# Altium footprint library ICs And Semiconductors THD.PcbLib: 350 footprints (part 2 of 22)
Each footprint in its own frame and in the unit in brackets; x right, y up, seen from the top. Pads: shape width x height; smd on the part's side, far side on the other; paste and mask are expansions set on the pad; w line width, h text height; cw(c..) or ccw(c..) is an arc to the next point about the centre after c.
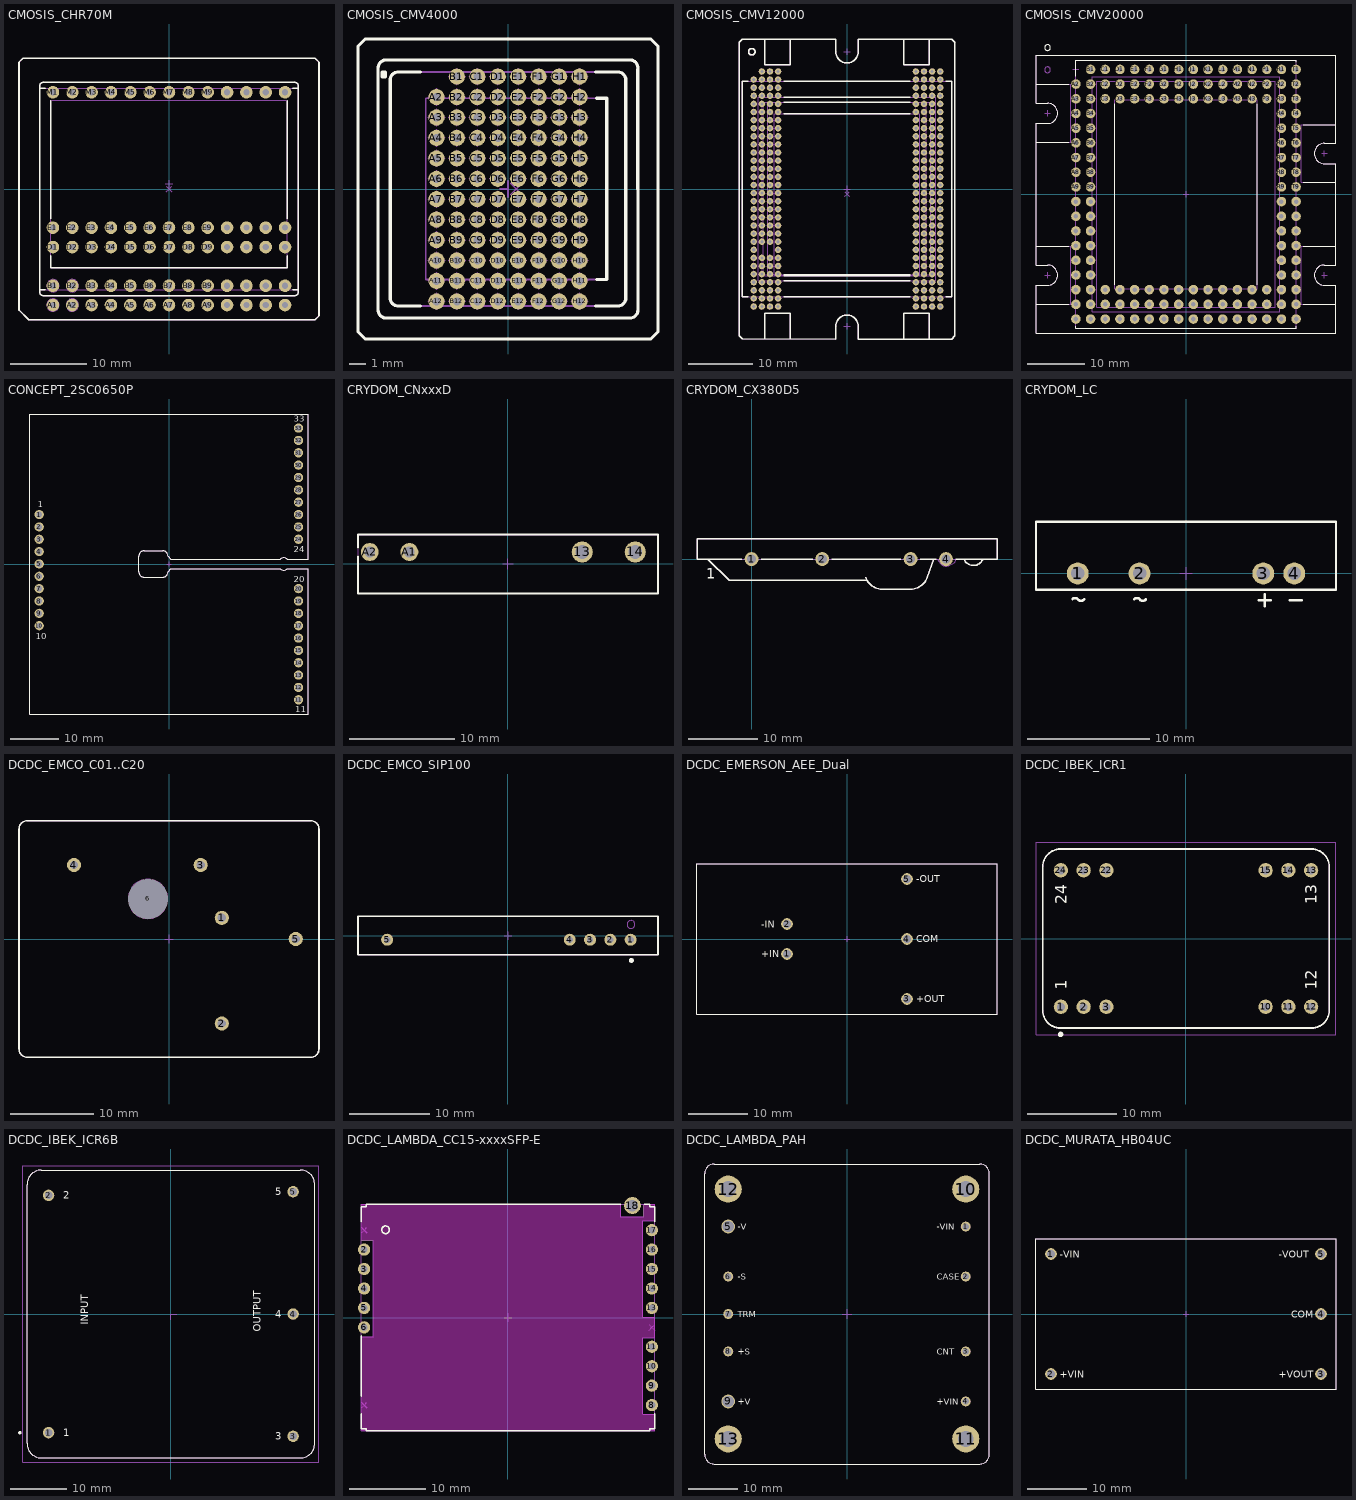
[diagram p1: the footprints below, top view; thin cyan lines are the x and y axes]

## CMOSIS_CHR70M [mm] "High Resolution 70 Megapixels CMOS Image Sensor"
height 6.24
pads (65):
  round 1.65 hole 0.8: A1(-15.24,-15.24) A2(-12.7,-15.24) A3(-10.16,-15.24) A4(-7.62,-15.24) A5(-5.08,-15.24) A6(-2.54,-15.24) A7(0,-15.24) A8(2.54,-15.24) A9(5.08,-15.24) A10(7.62,-15.24) A11(10.16,-15.24) A12(12.7,-15.24) A13(15.24,-15.24) B1(-15.24,-12.7) B2(-12.7,-12.7) B3(-10.16,-12.7) B4(-7.62,-12.7) B5(-5.08,-12.7) B6(-2.54,-12.7) B7(0,-12.7) B8(2.54,-12.7) B9(5.08,-12.7) B10(7.62,-12.7) B11(10.16,-12.7) B12(12.7,-12.7) B13(15.24,-12.7) D1(-15.24,-7.62) D2(-12.7,-7.62) D3(-10.16,-7.62) D4(-7.62,-7.62) D5(-5.08,-7.62) D6(-2.54,-7.62) D7(0,-7.62) D8(2.54,-7.62) D9(5.08,-7.62) D10(7.62,-7.62) D11(10.16,-7.62) D12(12.7,-7.62) D13(15.24,-7.62) E1(-15.24,-5.08) E2(-12.7,-5.08) E3(-10.16,-5.08) E4(-7.62,-5.08) E5(-5.08,-5.08) E6(-2.54,-5.08) E7(0,-5.08) E8(2.54,-5.08) E9(5.08,-5.08) E10(7.62,-5.08) E11(10.16,-5.08) E12(12.7,-5.08) E13(15.24,-5.08) M1(-15.24,12.7) M2(-12.7,12.7) M3(-10.16,12.7) M4(-7.62,12.7) M5(-5.08,12.7) M6(-2.54,12.7) M7(0,12.7) M8(2.54,12.7) M9(5.08,12.7) M10(7.62,12.7) M11(10.16,12.7) M12(12.7,12.7) M13(15.24,12.7)
Top Overlay:
  lines w0.2: -17,-13.25 -16.278,-13.25 ; -17,13.25 -16.278,13.25 ; -15.5,-8.766 -15.5,-10.33 15.5,-10.33 15.5,-8.766 ; -15.5,-3.934 -15.5,11.554 ; 15.5,-3.934 15.5,11.554 ; 16.278,-13.25 17,-13.25 ; 16.278,13.25 17,13.25 ; -19.695,-15.9 -18.425,-17.17 19.185,-17.17 19.695,-16.66 19.695,16.66 19.185,17.17 -19.185,17.17 -19.695,16.66 -19.695,-15.9 ; -17,-13.5 ccw(c-16.5,-13.5) -16.5,-14 16.5,-14 ccw(c16.5,-13.5) 17,-13.5 17,13.5 ccw(c16.5,13.5) 16.5,14 -16.5,14 ccw(c-16.5,13.5) -17,13.5 -17,-13.5
Notvisible:
  drawing of 269 lines, arcs and shapes, not listed
Mechanical 14:
  lines w0.1: -17,-13.25 17,-13.25 ; -17,13.25 17,13.25 ; -0.5,0.67 0,0.67 ; 0,0.17 0,0.67 ; 0,1.17 0,0.67 ; 0.5,0.67 0,0.67 ; -19.695,-15.9 -18.425,-17.17 19.185,-17.17 19.695,-16.66 19.695,16.66 19.185,17.17 -19.185,17.17 -19.695,16.66 -19.695,-15.9 ; -17,-13.5 ccw(c-16.5,-13.5) -16.5,-14 16.5,-14 ccw(c16.5,-13.5) 17,-13.5 17,13.5 ccw(c16.5,13.5) 16.5,14 -16.5,14 ccw(c-16.5,13.5) -17,13.5 -17,-13.5 ; -15.5,-10.33 15.5,-10.33 15.5,11.67 -15.5,11.67 -15.5,-10.33
3D body "CMOSIS_CHR70M_Part2.stp": height 6.24, standoff 5.54, extent -18.8,-16.3 18.8,16.3
3D body "CMOSIS_CHR70M_Part1.stp": height 5.54, standoff -3.17, extent -19.695,-17.17 19.695,17.17

## CMOSIS_CMV4000 [mm] "Megapixel machine vision CMOS image sensor"
height 3.58
pads (95):
  round 1 hole 0.5 unplated: A2(-4.445,5.715) A3(-4.445,4.445) A4(-4.445,3.175) A5(-4.445,1.905) A6(-4.445,0.635) A7(-4.445,-0.635) A8(-4.445,-1.905) A9(-4.445,-3.175) A10(-4.445,-4.445) A11(-4.445,-5.715) A12(-4.445,-6.985) B1(-3.175,6.985) B2(-3.175,5.715) B3(-3.175,4.445) B4(-3.175,3.175) B5(-3.175,1.905) B6(-3.175,0.635) B7(-3.175,-0.635) B8(-3.175,-1.905) B9(-3.175,-3.175) B10(-3.175,-4.445) B11(-3.175,-5.715) B12(-3.175,-6.985) C1(-1.905,6.985) C2(-1.905,5.715) C3(-1.905,4.445) C4(-1.905,3.175) C5(-1.905,1.905) C6(-1.905,0.635) C7(-1.905,-0.635) C8(-1.905,-1.905) C9(-1.905,-3.175) C10(-1.905,-4.445) C11(-1.905,-5.715) C12(-1.905,-6.985) D1(-0.635,6.985) D2(-0.635,5.715) D3(-0.635,4.445) D4(-0.635,3.175) D5(-0.635,1.905) D6(-0.635,0.635) D7(-0.635,-0.635) D8(-0.635,-1.905) D9(-0.635,-3.175) D10(-0.635,-4.445) D11(-0.635,-5.715) D12(-0.635,-6.985) E1(0.635,6.985) E2(0.635,5.715) E3(0.635,4.445) E4(0.635,3.175) E5(0.635,1.905) E6(0.635,0.635) E7(0.635,-0.635) E8(0.635,-1.905) E9(0.635,-3.175) E10(0.635,-4.445) E11(0.635,-5.715) E12(0.635,-6.985) F1(1.905,6.985) F2(1.905,5.715) F3(1.905,4.445) F4(1.905,3.175) F5(1.905,1.905) F6(1.905,0.635) F7(1.905,-0.635) F8(1.905,-1.905) F9(1.905,-3.175) F10(1.905,-4.445) F11(1.905,-5.715) F12(1.905,-6.985) G1(3.175,6.985) G2(3.175,5.715) G3(3.175,4.445) G4(3.175,3.175) G5(3.175,1.905) G6(3.175,0.635) G7(3.175,-0.635) G8(3.175,-1.905) G9(3.175,-3.175) G10(3.175,-4.445) G11(3.175,-5.715) G12(3.175,-6.985) H1(4.445,6.985) H2(4.445,5.715) H3(4.445,4.445) H4(4.445,3.175) H5(4.445,1.905) H6(4.445,0.635) H7(4.445,-0.635) H8(4.445,-1.905) H9(4.445,-3.175) H10(4.445,-4.445) H11(4.445,-5.715) H12(4.445,-6.985)
Top Overlay:
  lines w0.2: -5.454,-7.275 -6.825,-7.275 cw(c-6.825,-6.775) -7.325,-6.775 -7.325,6.775 cw(c-6.825,6.775) -6.825,7.275 -5.454,7.275 ; 5.454,-7.275 6.825,-7.275 ccw(c6.825,-6.775) 7.325,-6.775 7.325,6.775 ccw(c6.825,6.775) 6.825,7.275 5.454,7.275 ; 5.5,-5.625 6.145,-5.625 6.145,5.635 5.5,5.635 ; -9.325,-8.881 -9.325,8.881 -8.881,9.325 8.881,9.325 9.325,8.881 9.325,-8.881 8.881,-9.325 -8.881,-9.325 -9.325,-8.881 ; -8.075,-7.525 ccw(c-7.575,-7.525) -7.575,-8.025 7.575,-8.025 ccw(c7.575,-7.525) 8.075,-7.525 8.067,7.438 ccw(c7.575,7.525) 7.575,8.025 -7.575,8.025 ccw(c-7.575,7.525) -8.075,7.525 -8.075,-7.525 ; -7.825,6.97 -7.825,7.27 -7.625,7.27 -7.625,6.97 -7.825,6.97
Notvisible:
  drawing of 387 lines, arcs and shapes, not listed
Mechanical 14:
  lines w0.1: -9.325,-8.881 -9.325,8.881 -8.881,9.325 8.881,9.325 9.325,8.881 9.325,-8.881 8.881,-9.325 -8.881,-9.325 -9.325,-8.881 ; -8.075,-7.525 ccw(c-7.575,-7.525) -7.575,-8.025 7.575,-8.025 ccw(c7.575,-7.525) 8.075,-7.525 8.067,7.438 ccw(c7.575,7.525) 7.575,8.025 -7.575,8.025 ccw(c-7.575,7.525) -8.075,7.525 -8.075,-7.525 ; -7.825,6.97 -7.825,7.27 -7.625,7.27 -7.625,6.97 -7.825,6.97 ; -7.325,-6.775 ccw(c-6.825,-6.775) -6.825,-7.275 6.825,-7.275 ccw(c6.825,-6.775) 7.325,-6.775 7.325,6.775 ccw(c6.825,6.775) 6.825,7.275 -6.825,7.275 ccw(c-6.825,6.775) -7.325,6.775 -7.325,-6.775 ; -5.115,-5.625 6.145,-5.625 6.145,5.635 -5.115,5.635 -5.115,-5.625
3D body "CMOSIS_CMV4000.stp": height 3.58, standoff -2.7, extent -9.42,-9.42 9.42,9.42

## CMOSIS_CMV12000 [mm] "12 Megapixel Machine Vision CMOS Image Sensor"
height 3.78
pads (237):
  round 1 hole 0.5: A2(-14.605,17.145) A3(-14.605,15.875) A4(-14.605,14.605) A5(-14.605,13.335) A6(-14.605,12.065) A7(-14.605,10.795) A8(-14.605,9.525) A9(-14.605,8.255) A10(-14.605,6.985) A11(-14.605,5.715) A12(-14.605,4.445) A13(-14.605,3.175) A14(-14.605,1.905) A15(-14.605,0.635) A16(-14.605,-0.635) A17(-14.605,-1.905) A18(-14.605,-3.175) A19(-14.605,-4.445) A20(-14.605,-5.715) A21(-14.605,-6.985) A22(-14.605,-8.255) A23(-14.605,-9.525) A24(-14.605,-10.795) A25(-14.605,-12.065) A26(-14.605,-13.335) A27(-14.605,-14.605) A28(-14.605,-15.875) A29(-14.605,-17.145) A30(-14.605,-18.415) B1(-13.335,18.415) B2(-13.335,17.145) B3(-13.335,15.875) B4(-13.335,14.605) B5(-13.335,13.335) B6(-13.335,12.065) B7(-13.335,10.795) B8(-13.335,9.525) B9(-13.335,8.255) B10(-13.335,6.985) B11(-13.335,5.715) B12(-13.335,4.445) B13(-13.335,3.175) B14(-13.335,1.905) B15(-13.335,0.635) B16(-13.335,-0.635) B17(-13.335,-1.905) B18(-13.335,-3.175) B19(-13.335,-4.445) B20(-13.335,-5.715) B21(-13.335,-6.985) B22(-13.335,-8.255) B24(-13.335,-10.795) B25(-13.335,-12.065) B26(-13.335,-13.335) B27(-13.335,-14.605) B28(-13.335,-15.875) B29(-13.335,-17.145) B30(-13.335,-18.415) C1(-12.065,18.415) C2(-12.065,17.145) C3(-12.065,15.875) C4(-12.065,14.605) C5(-12.065,13.335) C6(-12.065,12.065) C7(-12.065,10.795) C8(-12.065,9.525) C9(-12.065,8.255) C10(-12.065,6.985) C11(-12.065,5.715) C12(-12.065,4.445) C13(-12.065,3.175) C14(-12.065,1.905) C15(-12.065,0.635) C16(-12.065,-0.635) C17(-12.065,-1.905) C18(-12.065,-3.175) C19(-12.065,-4.445) C20(-12.065,-5.715) C21(-12.065,-6.985) C22(-12.065,-8.255) C24(-12.065,-10.795) C25(-12.065,-12.065) C26(-12.065,-13.335) C27(-12.065,-14.605) C28(-12.065,-15.875) C29(-12.065,-17.145) C30(-12.065,-18.415) D1(-10.795,18.415) D2(-10.795,17.145) D3(-10.795,15.875) D4(-10.795,14.605) D5(-10.795,13.335) D6(-10.795,12.065) D7(-10.795,10.795) D8(-10.795,9.525) D9(-10.795,8.255) D10(-10.795,6.985) D11(-10.795,5.715) D12(-10.795,4.445) D13(-10.795,3.175) D14(-10.795,1.905) D15(-10.795,0.635) D16(-10.795,-0.635) D17(-10.795,-1.905) D18(-10.795,-3.175) D19(-10.795,-4.445) D20(-10.795,-5.715) D21(-10.795,-6.985) D22(-10.795,-8.255) D23(-10.795,-9.525) D24(-10.795,-10.795) D25(-10.795,-12.065) D26(-10.795,-13.335) D27(-10.795,-14.605) D28(-10.795,-15.875) D29(-10.795,-17.145) D30(-10.795,-18.415) E1(10.795,18.415) E2(10.795,17.145) E3(10.795,15.875) E4(10.795,14.605) E5(10.795,13.335) E6(10.795,12.065) E7(10.795,10.795) E8(10.795,9.525) E9(10.795,8.255) E10(10.795,6.985) E11(10.795,5.715) E12(10.795,4.445) E13(10.795,3.175) E14(10.795,1.905) E15(10.795,0.635) E16(10.795,-0.635) E17(10.795,-1.905) E18(10.795,-3.175) E19(10.795,-4.445) E20(10.795,-5.715) E21(10.795,-6.985) E22(10.795,-8.255) E23(10.795,-9.525) E24(10.795,-10.795) E25(10.795,-12.065) E26(10.795,-13.335) E27(10.795,-14.605) E28(10.795,-15.875) E29(10.795,-17.145) E30(10.795,-18.415) F1(12.065,18.415) F2(12.065,17.145) F3(12.065,15.875) F4(12.065,14.605) F5(12.065,13.335) F6(12.065,12.065) F7(12.065,10.795) F8(12.065,9.525) F9(12.065,8.255) F10(12.065,6.985) F11(12.065,5.715) F12(12.065,4.445) F13(12.065,3.175) F14(12.065,1.905) F15(12.065,0.635) F16(12.065,-0.635) F17(12.065,-1.905) F18(12.065,-3.175) F19(12.065,-4.445) F20(12.065,-5.715) F21(12.065,-6.985) F22(12.065,-8.255) F23(12.065,-9.525) F24(12.065,-10.795) F25(12.065,-12.065) F26(12.065,-13.335) F27(12.065,-14.605) F28(12.065,-15.875) F29(12.065,-17.145) F30(12.065,-18.415) G1(13.335,18.415) G2(13.335,17.145) G3(13.335,15.875) G4(13.335,14.605) G5(13.335,13.335) G6(13.335,12.065) G7(13.335,10.795) G8(13.335,9.525) G9(13.335,8.255) G10(13.335,6.985) G11(13.335,5.715) G12(13.335,4.445) G13(13.335,3.175) G14(13.335,1.905) G15(13.335,0.635) G16(13.335,-0.635) G17(13.335,-1.905) G18(13.335,-3.175) G19(13.335,-4.445) G20(13.335,-5.715) G21(13.335,-6.985) G22(13.335,-8.255) G23(13.335,-9.525) G24(13.335,-10.795) G25(13.335,-12.065) G26(13.335,-13.335) G27(13.335,-14.605) G28(13.335,-15.875) G29(13.335,-17.145) G30(13.335,-18.415) H1(14.605,18.415) H2(14.605,17.145) H3(14.605,15.875) H4(14.605,14.605) H5(14.605,13.335) H6(14.605,12.065) H7(14.605,10.795) H8(14.605,9.525) H9(14.605,8.255) H10(14.605,6.985) H11(14.605,5.715) H12(14.605,4.445) H13(14.605,3.175) H14(14.605,1.905) H15(14.605,0.635) H16(14.605,-0.635) H17(14.605,-1.905) H18(14.605,-3.175) H19(14.605,-4.445) H20(14.605,-5.715) H21(14.605,-6.985) H22(14.605,-8.255) H23(14.605,-9.525) H24(14.605,-10.795) H25(14.605,-12.065) H26(14.605,-13.335) H27(14.605,-14.605) H28(14.605,-15.875) H29(14.605,-17.145) H30(14.605,-18.415)
Top Overlay:
  circle w0.2: c-14.9,21.5 r0.5
  lines w0.2: -15.505,-16.85 -16.4,-16.85 -16.4,16.85 -15.505,16.85 ; -12.9,-23.5 -12.9,-19.5 -8.9,-19.5 -8.9,-23.5 ; -12.9,23.5 -12.9,19.5 -8.9,19.5 -8.9,23.5 ; -9.895,-16.85 9.895,-16.85 ; -9.895,-14.35 9.895,-14.35 ; -9.895,-13.6 9.895,-13.6 ; -9.895,13.6 9.895,13.6 ; -9.895,14.35 9.895,14.35 ; -9.895,16.85 9.895,16.85 ; 8.9,-23.5 8.9,-19.5 12.9,-19.5 12.9,-23.5 ; 8.9,23.5 8.9,19.5 12.9,19.5 12.9,23.5 ; 15.505,-16.85 16.4,-16.85 16.4,16.85 15.505,16.85 ; -16.9,-23 -16.9,23 -16.4,23.5 -1.75,23.5 -1.75,21.5 ccw(c0,21.5) 1.75,21.5 1.75,23.5 16.4,23.5 16.9,23 16.9,-23 16.4,-23.5 1.75,-23.5 1.75,-21.5 ccw(c0,-21.5) -1.75,-21.5 -1.75,-23.5 -16.4,-23.5 -16.9,-23 ; -9.895,-13.4 9.895,-13.4 -9.895,-13.4 ; -9.895,11.8 9.895,11.8 -9.895,11.8
Notvisible:
  drawing of 960 lines, arcs and shapes, not listed
Mechanical 14:
  circle w0.1: c-14.9,21.5 r0.5
  lines w0.1: -12.9,-23.5 -12.9,-19.5 -8.9,-19.5 -8.9,-23.5 ; -12.9,23.5 -12.9,19.5 -8.9,19.5 -8.9,23.5 ; -12.4,-13.6 -12.4,13.6 ; -0.354,-1.154 0,-0.8 ; -0.354,-0.446 0,-0.8 ; 0.354,-1.154 0,-0.8 ; 0.354,-0.446 0,-0.8 ; 8.9,-23.5 8.9,-19.5 12.9,-19.5 12.9,-23.5 ; 8.9,23.5 8.9,19.5 12.9,19.5 12.9,23.5 ; 12.4,-13.6 12.4,13.6 ; -11.4,-13.4 11.4,-13.4 ; -11.4,-13.4 -11.4,11.8 ; -11.4,-13.4 11.4,-13.4 ; -11.4,-13.4 -11.4,11.8 ; -11.4,11.8 11.4,11.8 ; -11.4,11.8 11.4,11.8 ; 11.4,-13.4 11.4,11.8 ; 11.4,-13.4 11.4,11.8 ; -16.9,-23 -16.9,23 -16.4,23.5 -1.75,23.5 -1.75,21.5 ccw(c0,21.5) 1.75,21.5 1.75,23.5 16.4,23.5 16.9,23 16.9,-23 16.4,-23.5 1.75,-23.5 1.75,-21.5 ccw(c0,-21.5) -1.75,-21.5 -1.75,-23.5 -16.4,-23.5 -16.9,-23 ; -16.4,-16.85 16.4,-16.85 16.4,16.85 -16.4,16.85 -16.4,-16.85 ; -13.9,-14.35 13.9,-14.35 13.9,14.35 -13.9,14.35 -13.9,-14.35 ; -13.15,-13.6 -13.15,13.6 13.15,13.6 13.15,-13.6 -13.15,-13.6
3D body "CMOSIS_CMV12000.stp": height 3.45, standoff -2.5, extent -16.9,-23.5 16.9,23.5

## CMOSIS_CMV20000 [mm] "20 Megapixel Global Shutter CMOS Image Sensor"
height 5.17
pads (143):
  round 1.65 hole 0.8: A2(-19.05,19.05) A3(-19.05,16.51) A4(-19.05,13.97) A5(-19.05,11.43) A6(-19.05,8.89) A7(-19.05,6.35) A8(-19.05,3.81) A9(-19.05,1.27) A10(-19.05,-1.27) A11(-19.05,-3.81) A12(-19.05,-6.35) A13(-19.05,-8.89) A14(-19.05,-11.43) A15(-19.05,-13.97) A16(-19.05,-16.51) A17(-19.05,-19.05) A18(-19.05,-21.59) B1(-16.51,21.59) B2(-16.51,19.05) B3(-16.51,16.51) B4(-16.51,13.97) B5(-16.51,11.43) B6(-16.51,8.89) B7(-16.51,6.35) B8(-16.51,3.81) B9(-16.51,1.27) B10(-16.51,-1.27) B11(-16.51,-3.81) B12(-16.51,-6.35) B13(-16.51,-8.89) B14(-16.51,-11.43) B15(-16.51,-13.97) B16(-16.51,-16.51) B17(-16.51,-19.05) B18(-16.51,-21.59) C1(-13.97,21.59) C2(-13.97,19.05) C3(-13.97,16.51) C16(-13.97,-16.51) C17(-13.97,-19.05) C18(-13.97,-21.59) D1(-11.43,21.59) D2(-11.43,19.05) D3(-11.43,16.51) D16(-11.43,-16.51) D17(-11.43,-19.05) D18(-11.43,-21.59) E1(-8.89,21.59) E2(-8.89,19.05) E3(-8.89,16.51) E16(-8.89,-16.51) E17(-8.89,-19.05) E18(-8.89,-21.59) F1(-6.35,21.59) F2(-6.35,19.05) F3(-6.35,16.51) F16(-6.35,-16.51) F17(-6.35,-19.05) F18(-6.35,-21.59) G1(-3.81,21.59) G2(-3.81,19.05) G3(-3.81,16.51) G16(-3.81,-16.51) G17(-3.81,-19.05) G18(-3.81,-21.59) H1(-1.27,21.59) H2(-1.27,19.05) H3(-1.27,16.51) H16(-1.27,-16.51) H17(-1.27,-19.05) H18(-1.27,-21.59) J1(1.27,21.59) J2(1.27,19.05) J3(1.27,16.51) J16(1.27,-16.51) J17(1.27,-19.05) J18(1.27,-21.59) K1(3.81,21.59) K2(3.81,19.05) K3(3.81,16.51) K16(3.81,-16.51) K17(3.81,-19.05) K18(3.81,-21.59) L1(6.35,21.59) L2(6.35,19.05) L3(6.35,16.51) L16(6.35,-16.51) L17(6.35,-19.05) L18(6.35,-21.59) M1(8.89,21.59) M2(8.89,19.05) M3(8.89,16.51) M16(8.89,-16.51) M17(8.89,-19.05) M18(8.89,-21.59) N1(11.43,21.59) N2(11.43,19.05) N3(11.43,16.51) N16(11.43,-16.51) N17(11.43,-19.05) N18(11.43,-21.59) P1(13.97,21.59) P2(13.97,19.05) P3(13.97,16.51) P16(13.97,-16.51) P17(13.97,-19.05) P18(13.97,-21.59) R1(16.51,21.59) R2(16.51,19.05) R3(16.51,16.51) R4(16.51,13.97) R5(16.51,11.43) R6(16.51,8.89) R7(16.51,6.35) R8(16.51,3.81) R9(16.51,1.27) R10(16.51,-1.27) R11(16.51,-3.81) R12(16.51,-6.35) R13(16.51,-8.89) R14(16.51,-11.43) R15(16.51,-13.97) R16(16.51,-16.51) R17(16.51,-19.05) R18(16.51,-21.59) T1(19.05,21.59) T2(19.05,19.05) T3(19.05,16.51) T4(19.05,13.97) T5(19.05,11.43) T6(19.05,8.89) T7(19.05,6.35) T8(19.05,3.81) T9(19.05,1.27) T10(19.05,-1.27) T11(19.05,-3.81) T12(19.05,-6.35) T13(19.05,-8.89) T14(19.05,-11.43) T15(19.05,-13.97) T16(19.05,-16.51) T17(19.05,-19.05) T18(19.05,-21.59)
Top Overlay:
  circle w0.1: c-23.95,25.363 r0.5
  lines w0.2: -25.95,-19 -20.275,-19 ; -25.95,-9 -20.275,-9 ; -25.95,9 -20.275,9 ; -25.95,19 -20.275,19 ; -19.1,-22.814 -19.1,-23.2 19.1,-23.2 19.1,-22.814 ; -19.1,20.45 -19.1,23.2 19.1,23.2 19.1,22.814 ; -12.29,-15.638 -12.29,15.638 ; 12.29,-15.638 12.29,15.638 ; 20.275,-19 25.95,-19 ; 20.275,-9 25.95,-9 ; 20.275,2.05 25.95,2.05 ; 20.275,12.05 25.95,12.05 ; -25.95,-24.05 25.95,-24.05 25.95,-15.75 23.95,-15.75 cw(c23.95,-14) 23.95,-12.25 25.95,-12.25 25.95,5.3 23.95,5.3 cw(c23.95,7.05) 23.95,8.8 25.95,8.8 25.95,24.05 -25.95,24.05 -25.95,15.75 -23.95,15.75 cw(c-23.95,14) -23.95,12.25 -25.95,12.25 -25.95,-12.25 -23.95,-12.25 cw(c-23.95,-14) -23.95,-15.75 -25.95,-15.75 -25.95,-24.05
Notvisible:
  drawing of 596 lines, arcs and shapes, not listed
Mechanical 14:
  circle w0.1: c-23.95,21.525 r0.5
  lines w0.1: -25.95,-19 -19.95,-19 -19.95,-9 -25.95,-9 ; -25.95,9 -19.95,9 -19.95,19 -25.95,19 ; 25.95,-19 19.95,-19 19.95,-9 25.95,-9 ; 25.95,2.05 19.95,2.05 19.95,12.05 25.95,12.05 ; -25.95,-24.05 25.95,-24.05 25.95,-15.75 23.95,-15.75 cw(c23.95,-14) 23.95,-12.25 25.95,-12.25 25.95,5.3 23.95,5.3 cw(c23.95,7.05) 23.95,8.8 25.95,8.8 25.95,24.05 -25.95,24.05 -25.95,15.75 -23.95,15.75 cw(c-23.95,14) -23.95,12.25 -25.95,12.25 -25.95,-12.25 -23.95,-12.25 cw(c-23.95,-14) -23.95,-15.75 -25.95,-15.75 -25.95,-24.05 ; -19.1,-23.2 19.1,-23.2 19.1,23.2 -19.1,23.2 -19.1,-23.2 ; -16.2,-20.3 -16.2,20.3 16.2,20.3 16.2,-20.3 -16.2,-20.3 ; -15.45,-19.55 15.45,-19.55 15.45,19.55 -15.45,19.55 -15.45,-19.55 ; -12.29,-16.385 12.29,-16.385 12.29,16.385 -12.29,16.385 -12.29,-16.385
3D body "CMV20000.stp": height 4.72, standoff -3.3, extent -25.95,-24.05 25.95,24.05

## CONCEPT_2SC0650P [mm] "Dual-Channel High-Power High-Frequency SCALE-2 Driver Core"
height 6.5
pads (30):
  round 1.9 hole 1.2: 1(-26.7,10.17) 2(-26.7,7.63) 3(-26.7,5.09) 4(-26.7,2.55) 5(-26.7,0.01) 6(-26.7,-2.53) 7(-26.7,-5.07) 8(-26.7,-7.61) 9(-26.7,-10.15) 10(-26.7,-12.69) 11(26.64,-27.93) 12(26.64,-25.39) 13(26.64,-22.85) 14(26.64,-20.31) 15(26.64,-17.77) 16(26.64,-15.23) 17(26.64,-12.69) 18(26.64,-10.15) 19(26.64,-7.61) 20(26.64,-5.07) 24(26.64,5.09) 25(26.64,7.63) 26(26.64,10.17) 27(26.64,12.71) 28(26.64,15.25) 29(26.64,17.79) 30(26.64,20.33) 31(26.64,22.87) 32(26.64,25.41) 33(26.64,27.95)
Top Overlay:
  lines w0.2: -28.6,-30.85 28.6,-30.85 28.6,-1 24.35,-1 cw(c23.6,0) 22.85,-1 0.4,-1 -0.2,-1.6 cw(c-1.3,-1.6) -1.3,-2.7 -5.1,-2.7 cw(c-5.1,-1.6) -6.2,-1.6 -6.2,1.6 cw(c-5.1,1.6) -5.1,2.7 -1.3,2.7 cw(c-1.3,1.6) -0.2,1.6 0.4,1 22.85,1 cw(c23.6,0) 24.35,1 28.6,1 28.6,30.85 -28.6,30.85 -28.6,-30.85
  text "1" at -26.973,11.627 h1.27
  text "10" at -27.453,-15.483 h1.27
  text "33" at 25.696,29.253 h1.27
  text "20" at 25.696,-3.767 h1.27
  text "24" at 25.684,2.387 h1.27
  text "11" at 25.94,-30.497 h1.27
Notvisible:
  lines w0.1: -27.2,-12.69 -26.7,-12.69 ; -27.2,-10.15 -26.7,-10.15 ; -27.2,-7.61 -26.7,-7.61 ; -27.2,-5.07 -26.7,-5.07 ; -27.2,-2.53 -26.7,-2.53 ; -27.2,0.01 -26.7,0.01 ; -27.2,2.55 -26.7,2.55 ; -27.2,5.09 -26.7,5.09 ; -27.2,7.63 -26.7,7.63 ; -27.2,10.17 -26.7,10.17 ; -26.7,-13.19 -26.7,-12.69 ; -26.7,-12.19 -26.7,-12.69 ; -26.7,-10.65 -26.7,-10.15 ; -26.7,-9.65 -26.7,-10.15 ; -26.7,-8.11 -26.7,-7.61 ; -26.7,-7.11 -26.7,-7.61 ; -26.7,-5.57 -26.7,-5.07 ; -26.7,-4.57 -26.7,-5.07 ; -26.7,-3.03 -26.7,-2.53 ; -26.7,-2.03 -26.7,-2.53 ; -26.7,-0.49 -26.7,0.01 ; -26.7,0.51 -26.7,0.01 ; -26.7,2.05 -26.7,2.55 ; -26.7,3.05 -26.7,2.55 ; -26.7,4.59 -26.7,5.09 ; -26.7,5.59 -26.7,5.09 ; -26.7,7.13 -26.7,7.63 ; -26.7,8.13 -26.7,7.63 ; -26.7,9.67 -26.7,10.17 ; -26.7,10.67 -26.7,10.17 ; -26.2,-12.69 -26.7,-12.69 ; -26.2,-10.15 -26.7,-10.15 ; -26.2,-7.61 -26.7,-7.61 ; -26.2,-5.07 -26.7,-5.07 ; -26.2,-2.53 -26.7,-2.53 ; -26.2,0.01 -26.7,0.01 ; -26.2,2.55 -26.7,2.55 ; -26.2,5.09 -26.7,5.09 ; -26.2,7.63 -26.7,7.63 ; -26.2,10.17 -26.7,10.17 ; -0.5,0 0,0 ; 0,-0.5 0,0 ; 0,0.5 0,0 ; 0.5,0 0,0 ; 26.14,-27.93 26.64,-27.93 ; 26.14,-25.39 26.64,-25.39 ; 26.14,-22.85 26.64,-22.85 ; 26.14,-20.31 26.64,-20.31 ; 26.14,-17.77 26.64,-17.77 ; 26.14,-15.23 26.64,-15.23 ; 26.14,-12.69 26.64,-12.69 ; 26.14,-10.15 26.64,-10.15 ; 26.14,-7.61 26.64,-7.61 ; 26.14,-5.07 26.64,-5.07 ; 26.14,5.09 26.64,5.09 ; 26.14,7.63 26.64,7.63 ; 26.14,10.17 26.64,10.17 ; 26.14,12.71 26.64,12.71 ; 26.14,15.25 26.64,15.25 ; 26.14,17.79 26.64,17.79 ; 26.14,20.33 26.64,20.33 ; 26.14,22.87 26.64,22.87 ; 26.14,25.41 26.64,25.41 ; 26.14,27.95 26.64,27.95 ; 26.64,-28.43 26.64,-27.93 ; 26.64,-27.43 26.64,-27.93 ; 26.64,-25.89 26.64,-25.39 ; 26.64,-24.89 26.64,-25.39 ; 26.64,-23.35 26.64,-22.85 ; 26.64,-22.35 26.64,-22.85 ; 26.64,-20.81 26.64,-20.31 ; 26.64,-19.81 26.64,-20.31 ; 26.64,-18.27 26.64,-17.77 ; 26.64,-17.27 26.64,-17.77 ; 26.64,-15.73 26.64,-15.23 ; 26.64,-14.73 26.64,-15.23 ; 26.64,-13.19 26.64,-12.69 ; 26.64,-12.19 26.64,-12.69 ; 26.64,-10.65 26.64,-10.15 ; 26.64,-9.65 26.64,-10.15 ; 26.64,-8.11 26.64,-7.61 ; 26.64,-7.11 26.64,-7.61 ; 26.64,-5.57 26.64,-5.07 ; 26.64,-4.57 26.64,-5.07 ; 26.64,4.59 26.64,5.09 ; 26.64,5.59 26.64,5.09 ; 26.64,7.13 26.64,7.63 ; 26.64,8.13 26.64,7.63 ; 26.64,9.67 26.64,10.17 ; 26.64,10.67 26.64,10.17 ; 26.64,12.21 26.64,12.71 ; 26.64,13.21 26.64,12.71 ; 26.64,14.75 26.64,15.25 ; 26.64,15.75 26.64,15.25 ; 26.64,17.29 26.64,17.79 ; 26.64,18.29 26.64,17.79 ; 26.64,19.83 26.64,20.33 ; 26.64,20.83 26.64,20.33 ; 26.64,22.37 26.64,22.87 ; 26.64,23.37 26.64,22.87 ; 26.64,24.91 26.64,25.41 ; 26.64,25.91 26.64,25.41 ; 26.64,27.45 26.64,27.95 ; 26.64,28.45 26.64,27.95 ; 27.14,-27.93 26.64,-27.93 ; 27.14,-25.39 26.64,-25.39 ; 27.14,-22.85 26.64,-22.85 ; 27.14,-20.31 26.64,-20.31 ; 27.14,-17.77 26.64,-17.77 ; 27.14,-15.23 26.64,-15.23 ; 27.14,-12.69 26.64,-12.69 ; 27.14,-10.15 26.64,-10.15 ; 27.14,-7.61 26.64,-7.61 ; 27.14,-5.07 26.64,-5.07 ; 27.14,5.09 26.64,5.09 ; 27.14,7.63 26.64,7.63 ; 27.14,10.17 26.64,10.17 ; 27.14,12.71 26.64,12.71 ; 27.14,15.25 26.64,15.25 ; 27.14,17.79 26.64,17.79 ; 27.14,20.33 26.64,20.33 ; 27.14,22.87 26.64,22.87 ; 27.14,25.41 26.64,25.41 ; 27.14,27.95 26.64,27.95
Mechanical 14:
  lines w0.1: -28.6,-30.85 28.6,-30.85 28.6,-1 24.35,-1 cw(c23.6,0) 22.85,-1 0.4,-1 -0.2,-1.6 cw(c-1.3,-1.6) -1.3,-2.7 -5.1,-2.7 cw(c-5.1,-1.6) -6.2,-1.6 -6.2,1.6 cw(c-5.1,1.6) -5.1,2.7 -1.3,2.7 cw(c-1.3,1.6) -0.2,1.6 0.4,1 22.85,1 cw(c23.6,0) 24.35,1 28.6,1 28.6,30.85 -28.6,30.85 -28.6,-30.85
  text "1" at -26.973,11.627 h1.27
  text "10" at -27.453,-15.483 h1.27
  text "33" at 25.696,29.253 h1.27
  text "20" at 25.696,-3.767 h1.27
  text "24" at 25.684,2.387 h1.27
  text "11" at 25.94,-30.497 h1.27
3D body "CONCEPT_2SC0650P.stp": height 6.68, standoff -2.54, extent -28.6,-30.85 28.6,30.85

## CRYDOM_CNxxxD [mm] "PCB Mount Mini-SIP Solid State Relay , Body 28mm x 5mm"
height 15.48
pads (4):
  round 2 hole 1.3: 13(7.036,1.138) 14(12.065,1.138)
  round 1.7 hole 1: A1(-9.347,1.138) A2(-13.108,1.138)
Top Overlay:
  lines w0.2: -14.22,0.688 -14.22,-2.79 14.22,-2.79 14.22,2.79 -14.22,2.79 -14.22,1.588
Notvisible:
  lines w0.1: -13.608,1.138 -13.108,1.138 ; -13.108,0.638 -13.108,1.138 ; -13.108,1.638 -13.108,1.138 ; -12.608,1.138 -13.108,1.138 ; -9.847,1.138 -9.347,1.138 ; -9.347,0.638 -9.347,1.138 ; -9.347,1.638 -9.347,1.138 ; -8.847,1.138 -9.347,1.138 ; -0.5,0 0,0 ; 0,-0.5 0,0 ; 0,0.5 0,0 ; 0.5,0 0,0 ; 6.536,1.138 7.036,1.138 ; 7.036,0.638 7.036,1.138 ; 7.036,1.638 7.036,1.138 ; 7.536,1.138 7.036,1.138 ; 11.565,1.138 12.065,1.138 ; 12.065,0.638 12.065,1.138 ; 12.065,1.638 12.065,1.138 ; 12.565,1.138 12.065,1.138
Mechanical 14:
  lines w0.1: -14.22,-2.79 -14.22,2.79 14.22,2.79 14.22,-2.79 -14.22,-2.79
3D body "CRYDOM_CNxxxD.stp": height 15.49, standoff -3.59, extent -14.22,-2.79 14.22,2.79

## CRYDOM_CX380D5 [mm] "CRYDOM CX Serie, 4 Leads, Body 43.1 x 7.6mm, SIP Solid State Relay"
height 26.7
pads (4):
  round 2 hole 1.3: 1(0,0) 2(10.16,0) 3(22.86,0) 4(27.94,0)
Top Overlay:
  lines w0.2: -6.263,0 -3.215,-3.048 16.581,-3.048 ; -1.4,0 -7.834,0 -7.834,2.911 35.266,2.911 35.266,0 29.34,0 ; 1.4,0 8.76,0 ; 11.56,0 21.46,0 ; 16.379,-2.605 ccw(c18.781,-1.778) 18.781,-4.318 22.852,-4.318 ccw(c22.852,-1.778) 25.253,-2.605 26.15,0 ; 24.26,0 26.54,0 ; 30.534,0 ccw(c31.89,0.544) 33.11,-0.258 33.28,0
  text "1" at -6.5,-2.8 h1.5
Notvisible:
  lines w0.1: -0.5,0 0,0 ; 0,-0.5 0,0 ; 0,0.5 0,0 ; 0.5,0 0,0 ; 9.66,0 10.16,0 ; 10.16,-0.5 10.16,0 ; 10.16,0.5 10.16,0 ; 10.66,0 10.16,0 ; 22.36,0 22.86,0 ; 22.86,-0.5 22.86,0 ; 22.86,0.5 22.86,0 ; 23.36,0 22.86,0 ; 27.44,0 27.94,0 ; 27.94,-0.5 27.94,0 ; 27.94,0.5 27.94,0 ; 28.44,0 27.94,0
Mechanical 14:
  lines w0.1: -6.263,0 -3.215,-3.048 16.581,-3.048 ; 16.379,-2.605 ccw(c18.781,-1.778) 18.781,-4.318 22.852,-4.318 ccw(c22.852,-1.778) 25.253,-2.605 26.15,0 ; 26.695,0 26.936,-0.365 ccw(c28.08,0.544) 29.435,0 ; 27.053,-0.495 ccw(c27.94,0) 28.48,-0.861 ; 30.534,0 ccw(c31.89,0.544) 33.11,-0.258 33.28,0 ; -7.834,0 -7.834,2.911 35.266,2.911 35.266,0 -7.834,0
  text "1" at -6.5,-2.8 h1.5
3D body "CRYDOM_CX380D5.stp": height 26.7, standoff -5.08, extent -7.834,-4.318 35.266,2.911

## CRYDOM_LC [mm] "CRYDOM LC Serie, 4 Leads, Body 24.1mm x 5.1mm, Mini-SIP SSR (Solid State Relay)"
height 13.2
pads (4):
  round 1.8 hole 1.1: 1(-8.89,0) 2(-3.81,0) 3(6.35,0) 4(8.89,0)
Top Overlay:
  lines w0.2: -9.32,-2.109 cw(c-9.104,-2.317) -8.855,-2.15 ccw(c-8.626,-1.956) -8.369,-2.11 ; -4.24,-2.109 cw(c-4.024,-2.317) -3.775,-2.15 ccw(c-3.546,-1.956) -3.289,-2.11 ; 5.975,-2.2 6.475,-2.2 ; 6.475,-2.7 6.475,-2.2 ; 6.475,-1.7 6.475,-2.2 ; 6.975,-2.2 6.475,-2.2 ; 8.515,-2.2 9.015,-2.2 9.515,-2.2 ; -12.315,-1.329 12.315,-1.329 12.315,4.251 -12.315,4.251 -12.315,-1.329
Notvisible:
  lines w0.1: -9.39,0 -8.89,0 ; -8.89,-0.5 -8.89,0 ; -8.89,0.5 -8.89,0 ; -8.39,0 -8.89,0 ; -4.31,0 -3.81,0 ; -3.81,-0.5 -3.81,0 ; -3.81,0.5 -3.81,0 ; -3.31,0 -3.81,0 ; -0.5,0 0,0 ; 0,-0.5 0,0 ; 0,0.5 0,0 ; 0.5,0 0,0 ; 5.85,0 6.35,0 ; 6.35,-0.5 6.35,0 ; 6.35,0.5 6.35,0 ; 6.85,0 6.35,0 ; 8.39,0 8.89,0 ; 8.89,-0.5 8.89,0 ; 8.89,0.5 8.89,0 ; 9.39,0 8.89,0
Mechanical 14:
  lines w0.1: -9.32,-2.109 cw(c-9.104,-2.317) -8.855,-2.15 ccw(c-8.626,-1.956) -8.369,-2.11 ; -4.24,-2.109 cw(c-4.024,-2.317) -3.775,-2.15 ccw(c-3.546,-1.956) -3.289,-2.11 ; 5.975,-2.2 6.475,-2.2 ; 6.475,-2.7 6.475,-2.2 ; 6.475,-1.7 6.475,-2.2 ; 6.975,-2.2 6.475,-2.2 ; 8.515,-2.2 9.015,-2.2 9.515,-2.2 ; -12.315,-1.329 12.315,-1.329 12.315,4.251 -12.315,4.251 -12.315,-1.329
3D body "CRYDOM_LC.stp": height 13.2, standoff -3.6, extent -12.315,-1.329 12.315,4.251

## DCDC_EMCO_C01..C20 [mm] "C Series , Body 35.56 x 27.94mm, High Voltage DC-DC Converter"
height 13.21
pads (6):
  round 1.7 hole 1: 1(6.35,2.54) 2(6.35,-10.16) 3(3.81,8.89) 4(-11.43,8.89) 5(15.24,0)
  round 1 hole 4.8 unplated mask+1.9: 6(-2.54,4.83)
Top Overlay:
  lines w0.2: -18.035,-13.225 ccw(c-17.035,-13.225) -17.035,-14.225 17.035,-14.225 ccw(c17.035,-13.225) 18.035,-13.225 18.035,13.225 ccw(c17.035,13.225) 17.035,14.225 -17.035,14.225 ccw(c-17.035,13.225) -18.035,13.225 -18.035,-13.225
Notvisible:
  circle w0.1: c-2.54,4.83 r2.375
  lines w0.1: -11.93,8.89 -11.43,8.89 ; -11.43,8.39 -11.43,8.89 ; -11.43,9.39 -11.43,8.89 ; -10.93,8.89 -11.43,8.89 ; -3.04,4.83 -2.54,4.83 ; -2.54,4.33 -2.54,4.83 ; -2.54,5.33 -2.54,4.83 ; -2.04,4.83 -2.54,4.83 ; -0.5,0 0,0 ; 0,-0.5 0,0 ; 0,0.5 0,0 ; 0.5,0 0,0 ; 3.31,8.89 3.81,8.89 ; 3.81,8.39 3.81,8.89 ; 3.81,9.39 3.81,8.89 ; 4.31,8.89 3.81,8.89 ; 5.85,-10.16 6.35,-10.16 ; 5.85,2.54 6.35,2.54 ; 6.35,-10.66 6.35,-10.16 ; 6.35,-9.66 6.35,-10.16 ; 6.35,2.04 6.35,2.54 ; 6.35,3.04 6.35,2.54 ; 6.85,-10.16 6.35,-10.16 ; 6.85,2.54 6.35,2.54 ; 14.74,0 15.24,0 ; 15.24,-0.5 15.24,0 ; 15.24,0.5 15.24,0 ; 15.74,0 15.24,0
Mechanical 14:
  lines w0.1: -18.035,-13.225 ccw(c-17.035,-13.225) -17.035,-14.225 17.035,-14.225 ccw(c17.035,-13.225) 18.035,-13.225 18.035,13.225 ccw(c17.035,13.225) 17.035,14.225 -17.035,14.225 ccw(c-17.035,13.225) -18.035,13.225 -18.035,-13.225
3D body "DCDC_EMCO_C.stp": height 13.21, standoff -3.8, extent -18.035,-14.225 18.035,14.225

## DCDC_EMCO_SIP100 [mm] "SIP Series Model 100 , Body 36.8 x 4.06mm, Regulated, Low Profile High Voltage DC-DC Converter"
height 19.81
pads (5):
  round 1.5 hole 0.8: 1(15.35,-0.51) 2(12.81,-0.51) 3(10.27,-0.51) 4(7.73,-0.51) 5(-15.13,-0.51)
Top Overlay:
  circle w0.3: c15.45,-3.1 r0.15
  lines w0.2: -18.78,-2.41 18.78,-2.41 18.78,2.41 -18.78,2.41 -18.78,-2.41
Notvisible:
  lines w0.1: -15.63,-0.51 -15.13,-0.51 ; -15.13,-1.01 -15.13,-0.51 ; -15.13,-0.01 -15.13,-0.51 ; -14.63,-0.51 -15.13,-0.51 ; -0.5,0 0,0 ; 0,-0.5 0,0 ; 0,0.5 0,0 ; 0.5,0 0,0 ; 7.23,-0.51 7.73,-0.51 ; 7.73,-1.01 7.73,-0.51 ; 7.73,-0.01 7.73,-0.51 ; 8.23,-0.51 7.73,-0.51 ; 9.77,-0.51 10.27,-0.51 ; 10.27,-1.01 10.27,-0.51 ; 10.27,-0.01 10.27,-0.51 ; 10.77,-0.51 10.27,-0.51 ; 12.31,-0.51 12.81,-0.51 ; 12.81,-1.01 12.81,-0.51 ; 12.81,-0.01 12.81,-0.51 ; 13.31,-0.51 12.81,-0.51 ; 14.85,-0.51 15.35,-0.51 ; 15.35,-1.01 15.35,-0.51 ; 15.35,-0.01 15.35,-0.51 ; 15.85,-0.51 15.35,-0.51
Mechanical 14:
  circle w0.1: c15.4,1.4 r0.5
  lines w0.1: -18.78,-2.41 18.78,-2.41 18.78,2.41 -18.78,2.41 -18.78,-2.41
3D body "DCDC_EMCO_SIP100.stp": height 19.81, standoff -3.6, extent -18.78,-2.41 18.78,2.41

## DCDC_EMERSON_AEE_Dual [mm] "AEE 15W Series , Dual Output DCDC Converter, Body 50.8x25.4mm, Height 11.3mm"
height 11.3
pads (5):
  round 2 hole 1.3: 1(-10.16,-2.54) 2(-10.16,2.54) 3(10.16,-10.16) 4(10.16,0) 5(10.16,10.16)
Top Overlay:
  lines w0.2: -25.4,-12.7 -25.4,12.7 25.4,12.7 25.4,-12.7 -25.4,-12.7
  text "-IN" at -14.55,1.9 h1.2
  text "-OUT" at 11.71,9.645 h1.2
  text "+OUT" at 11.71,-10.675 h1.2
  text "+IN" at -14.55,-3.1 h1.2
  text "COM" at 11.71,-0.515 h1.2
Notvisible:
  lines w0.1: -10.66,-2.54 -10.16,-2.54 ; -10.66,2.54 -10.16,2.54 ; -10.16,-3.04 -10.16,-2.54 ; -10.16,-2.04 -10.16,-2.54 ; -10.16,2.04 -10.16,2.54 ; -10.16,3.04 -10.16,2.54 ; -9.66,-2.54 -10.16,-2.54 ; -9.66,2.54 -10.16,2.54 ; -0.5,0 0,0 ; 0,-0.5 0,0 ; 0,0.5 0,0 ; 0.5,0 0,0 ; 9.66,-10.16 10.16,-10.16 ; 9.66,0 10.16,0 ; 9.66,10.16 10.16,10.16 ; 10.16,-10.66 10.16,-10.16 ; 10.16,-9.66 10.16,-10.16 ; 10.16,-0.5 10.16,0 ; 10.16,0.5 10.16,0 ; 10.16,9.66 10.16,10.16 ; 10.16,10.66 10.16,10.16 ; 10.66,-10.16 10.16,-10.16 ; 10.66,0 10.16,0 ; 10.66,10.16 10.16,10.16
Mechanical 14:
  lines w0.1: -25.4,-12.7 -25.4,12.7 25.4,12.7 25.4,-12.7 -25.4,-12.7
  text "+OUT" at 11.71,-10.675 h1.2
  text "-OUT" at 11.71,9.645 h1.2
  text "+IN" at -14.55,-3.1 h1.2
  text "-IN" at -14.55,1.9 h1.2
  text "COM" at 11.71,-0.515 h1.2
3D body "DCDC_EMERSON_AEE_Dual.stp": height 11.3, standoff -3.8, extent -25.4,-12.7 25.4,12.7

## DCDC_IBEK_ICR1 [mm] "ICR1 Series , Body 32x20mm, Pitch 2.54mm"
height 10.5
pads (12):
  round 1.6 hole 0.9: 1(-13.97,-7.62) 2(-11.43,-7.62) 3(-8.89,-7.62) 10(8.89,-7.62) 11(11.43,-7.62) 12(13.97,-7.62) 13(13.97,7.62) 14(11.43,7.62) 15(8.89,7.62) 22(-8.89,7.62) 23(-11.43,7.62) 24(-13.97,7.62)
Top Overlay:
  circle w0.3: c-14,-10.7 r0.15
  lines w0.2: -16,-8 ccw(c-14,-8) -14,-10 14,-10 ccw(c14,-8) 16,-8 16,8 ccw(c14,8) 14,10 -14,10 ccw(c-14,8) -16,8 -16,-8
  text "1" at -13.335,-5.715 h1.27
  text "13" at 14.605,3.81 h1.27
  text "24" at -13.335,3.81 h1.27
  text "12" at 14.605,-5.715 h1.27
Mechanical 14:
  lines w0.1: -16,-8 ccw(c-14,-8) -14,-10 14,-10 ccw(c14,-8) 16,-8 16,8 ccw(c14,8) 14,10 -14,10 ccw(c-14,8) -16,8 -16,-8
  text "1" at -13.335,-5.715 h1.27
  text "12" at 14.605,-5.715 h1.27
  text "13" at 14.605,3.81 h1.27
  text "24" at -13.335,3.81 h1.27
Mechanical 15:
  lines w0.05: -16.75,-10.75 16.75,-10.75 16.75,10.75 -16.75,10.75 -16.75,-10.75
3D body "DCDC_IBEK_ICR1.stp": height 10.5, standoff -3, extent -16,-10 16,10

## DCDC_IBEK_ICR6B [mm] "ICR6 Series , Body 50.8x50.8mm"
height 10.5
pads (5):
  round 2 hole 1.3: 1(-21.59,-20.955) 2(-21.59,20.955) 3(21.59,-21.59) 4(21.59,0) 5(21.59,21.59)
Top Overlay:
  circle w0.3: c-26.67,-20.955 r0.15
  lines w0.2: -25.4,-22.86 ccw(c-22.86,-22.86) -22.86,-25.4 22.86,-25.4 ccw(c22.86,-22.86) 25.4,-22.86 25.4,22.86 ccw(c22.86,22.86) 22.86,25.4 -22.86,25.4 ccw(c-22.86,22.86) -25.4,22.86 -25.4,-22.86
  text "OUTPUT" at 15.875,-3.175 h1.27
  text "INPUT" at -14.605,-1.905 h1.27
  text "1" at -19.05,-21.59 h1.27
  text "2" at -19.05,20.32 h1.27
  text "5" at 18.415,20.955 h1.27
  text "4" at 18.415,-0.635 h1.27
  text "3" at 18.415,-22.225 h1.27
Notvisible:
  circle w0.1: c-21.59,20.955 r0.5
  circle w0.1: c21.59,21.59 r0.5
  circle w0.1: c21.59,0 r0.5
  circle w0.1: c21.59,-21.59 r0.5
  circle w0.1: c-21.59,-20.955 r0.5
  lines w0.2: -21.59,-21.955 -21.59,-20.955 -20.59,-20.955 ; -21.59,19.955 -21.59,20.955 -20.59,20.955 ; 0,-1 0,0 1,0 ; 21.59,-22.59 21.59,-21.59 22.59,-21.59 ; 21.59,-1 21.59,0 22.59,0 ; 21.59,20.59 21.59,21.59 22.59,21.59
Mechanical 14:
  lines w0.1: -25.4,-22.86 ccw(c-22.86,-22.86) -22.86,-25.4 22.86,-25.4 ccw(c22.86,-22.86) 25.4,-22.86 25.4,22.86 ccw(c22.86,22.86) 22.86,25.4 -22.86,25.4 ccw(c-22.86,22.86) -25.4,22.86 -25.4,-22.86
  text "OUTPUT" at 15.875,-3.175 h1.27
  text "INPUT" at -14.605,-1.905 h1.27
  text "1" at -19.05,-21.59 h1.27
  text "2" at -19.05,20.32 h1.27
  text "5" at 18.415,20.955 h1.27
  text "4" at 18.415,-0.635 h1.27
  text "3" at 18.415,-22.225 h1.27
Mechanical 15:
  lines w0.05: -26.15,-26.15 26.15,-26.15 26.15,26.15 -26.15,26.15 -26.15,-26.15
3D body "DCDC_IBEK_ICR6B.stp": height 10.5, standoff -3, extent -25.4,-25.4 25.4,25.4

## DCDC_LAMBDA_CC15-xxxxSFP-E [mm] "CCP-E Series, Body L 38.4mm x W 29.6mm x H 6.8mm"
height 6.8
pads (15):
  round 1.6 hole 0.9: 2(-18.8,8.89) 3(-18.8,6.35) 4(-18.8,3.81) 5(-18.8,1.27) 6(-18.8,-1.27) 8(18.8,-11.43) 9(18.8,-8.89) 10(18.8,-6.35) 11(18.8,-3.81) 13(18.8,1.27) 14(18.8,3.81) 15(18.8,6.35) 16(18.8,8.89) 17(18.8,11.43)
  round 2.2 hole 1.5: 18(16.26,14.65)
Top Layer keep-out:
  region: -19.2,-2.47 -17.6,-2.47 -17.6,10.09 -19.2,10.09 -19.2,14.8 14.76,14.8 14.76,13.15 17.76,13.15 17.76,14.8 19.2,14.8 19.2,12.63 17.6,12.63 17.6,0.07 19.2,0.07 19.2,-2.61 17.6,-2.61 17.6,-12.63 19.2,-12.63 19.2,-14.8 -19.2,-14.8
Top Overlay:
  circle w0.2: c-16,11.48 r0.5
  lines w0.2: -19.2,-12.561 -19.2,-14.5 -18.5,-14.5 -18.5,-14.8 18.5,-14.8 18.5,-14.5 19.2,-14.5 19.2,-12.561 ; -19.2,-10.299 -19.2,-2.401 ; -19.2,12.561 -19.2,14.5 -18.5,14.5 -18.5,14.8 14.732,14.8 ; 17.78,14.8 18.5,14.8 18.5,14.5 19.2,14.5 19.2,12.561
Notvisible:
  lines w0.1: -19.3,-1.27 -18.8,-1.27 ; -19.3,1.27 -18.8,1.27 ; -19.3,3.81 -18.8,3.81 ; -19.3,6.35 -18.8,6.35 ; -19.3,8.89 -18.8,8.89 ; -19.154,-11.784 -18.8,-11.43 ; -19.154,-11.076 -18.8,-11.43 ; -19.154,11.076 -18.8,11.43 ; -19.154,11.784 -18.8,11.43 ; -18.8,-1.77 -18.8,-1.27 ; -18.8,-0.77 -18.8,-1.27 ; -18.8,0.77 -18.8,1.27 ; -18.8,1.77 -18.8,1.27 ; -18.8,3.31 -18.8,3.81 ; -18.8,4.31 -18.8,3.81 ; -18.8,5.85 -18.8,6.35 ; -18.8,6.85 -18.8,6.35 ; -18.8,8.39 -18.8,8.89 ; -18.8,9.39 -18.8,8.89 ; -18.446,-11.784 -18.8,-11.43 ; -18.446,-11.076 -18.8,-11.43 ; -18.446,11.076 -18.8,11.43 ; -18.446,11.784 -18.8,11.43 ; -18.3,-1.27 -18.8,-1.27 ; -18.3,1.27 -18.8,1.27 ; -18.3,3.81 -18.8,3.81 ; -18.3,6.35 -18.8,6.35 ; -18.3,8.89 -18.8,8.89 ; -0.5,0 0,0 ; 0,-0.5 0,0 ; 0,0.5 0,0 ; 0.5,0 0,0 ; 15.76,14.65 16.26,14.65 ; 16.26,14.15 16.26,14.65 ; 16.26,15.15 16.26,14.65 ; 16.76,14.65 16.26,14.65 ; 18.3,-11.43 18.8,-11.43 ; 18.3,-8.89 18.8,-8.89 ; 18.3,-6.35 18.8,-6.35 ; 18.3,-3.81 18.8,-3.81 ; 18.3,1.27 18.8,1.27 ; 18.3,3.81 18.8,3.81 ; 18.3,6.35 18.8,6.35 ; 18.3,8.89 18.8,8.89 ; 18.3,11.43 18.8,11.43 ; 18.446,-1.624 18.8,-1.27 ; 18.446,-0.916 18.8,-1.27 ; 18.8,-11.93 18.8,-11.43 ; 18.8,-10.93 18.8,-11.43 ; 18.8,-9.39 18.8,-8.89 ; 18.8,-8.39 18.8,-8.89 ; 18.8,-6.85 18.8,-6.35 ; 18.8,-5.85 18.8,-6.35 ; 18.8,-4.31 18.8,-3.81 ; 18.8,-3.31 18.8,-3.81 ; 18.8,0.77 18.8,1.27 ; 18.8,1.77 18.8,1.27 ; 18.8,3.31 18.8,3.81 ; 18.8,4.31 18.8,3.81 ; 18.8,5.85 18.8,6.35 ; 18.8,6.85 18.8,6.35 ; 18.8,8.39 18.8,8.89 ; 18.8,9.39 18.8,8.89 ; 18.8,10.93 18.8,11.43 ; 18.8,11.93 18.8,11.43 ; 19.154,-1.624 18.8,-1.27 ; 19.154,-0.916 18.8,-1.27 ; 19.3,-11.43 18.8,-11.43 ; 19.3,-8.89 18.8,-8.89 ; 19.3,-6.35 18.8,-6.35 ; 19.3,-3.81 18.8,-3.81 ; 19.3,1.27 18.8,1.27 ; 19.3,3.81 18.8,3.81 ; 19.3,6.35 18.8,6.35 ; 19.3,8.89 18.8,8.89 ; 19.3,11.43 18.8,11.43 ; -19.2,-14.8 19.2,-14.8 19.2,-12.63 17.6,-12.63 17.6,-2.61 19.2,-2.61 19.2,0.07 17.6,0.07 17.6,12.63 19.2,12.63 19.2,14.8 17.76,14.8 17.76,13.15 14.76,13.15 14.76,14.8 -19.2,14.8 -19.2,10.09 -17.6,10.09 -17.6,-2.47 -19.2,-2.47 -19.2,-14.8
Mechanical 14:
  circle w0.1: c-16,11.48 r0.5
  lines w0.1: -19.2,-14.5 -19.2,14.5 -18.5,14.5 -18.5,14.8 18.5,14.8 18.5,14.5 19.2,14.5 19.2,-14.5 18.5,-14.5 18.5,-14.8 -18.5,-14.8 -18.5,-14.5 -19.2,-14.5
3D body "DC-DC_LAMBDA_CC15-xxxxSFP-E.stp": height 6.3, standoff -2.5, extent -19.2,-14.8 19.2,14.8

## DCDC_LAMBDA_PAH [mm] "PAH Series , Body 57.9x61mm"
height 12.95
pads (13):
  round 2 hole 1.3: 1(24.15,17.78) 2(24.15,7.62) 3(24.15,-7.62) 4(24.15,-17.78) 6(-24.15,7.62) 7(-24.15,0) 8(-24.15,-7.62)
  round 2.8 hole 2.3: 5(-24.15,17.78) 9(-24.15,-17.78)
  round 5.5 hole 3.2: 10(24.15,25.4) 11(24.15,-25.4) 12(-24.15,25.4) 13(-24.15,-25.4)
Top Overlay:
  lines w0.2: -28.95,-28.5 ccw(c-26.95,-28.5) -26.95,-30.5 26.95,-30.5 ccw(c26.95,-28.5) 28.95,-28.5 28.95,28.5 ccw(c26.95,28.5) 26.95,30.5 -26.95,30.5 ccw(c-26.95,28.5) -28.95,28.5 -28.95,-28.5
  text "TRM" at -22.175,-0.695 h1.27
  text "-VIN" at 18.265,17.125 h1.27
  text "-S" at -22.175,6.925 h1.27
  text "+S" at -22.175,-8.315 h1.27
  text "+V" at -22.175,-18.475 h1.27
  text "-V" at -22.175,17.085 h1.27
  text "CASE" at 18.265,6.965 h1.27
  text "CNT" at 18.265,-8.275 h1.27
  text "+VIN" at 18.265,-18.435 h1.27
Notvisible:
  lines w0.1: -25.15,-25.4 -24.15,-25.4 ; -25.15,-17.78 -24.15,-17.78 ; -25.15,-7.62 -24.15,-7.62 ; -25.15,0 -24.15,0 ; -25.15,7.62 -24.15,7.62 ; -25.15,17.78 -24.15,17.78 ; -25.15,25.4 -24.15,25.4 ; -24.15,-26.4 -24.15,-25.4 ; -24.15,-24.4 -24.15,-25.4 ; -24.15,-18.78 -24.15,-17.78 ; -24.15,-16.78 -24.15,-17.78 ; -24.15,-8.62 -24.15,-7.62 ; -24.15,-6.62 -24.15,-7.62 ; -24.15,-1 -24.15,0 ; -24.15,1 -24.15,0 ; -24.15,6.62 -24.15,7.62 ; -24.15,8.62 -24.15,7.62 ; -24.15,16.78 -24.15,17.78 ; -24.15,18.78 -24.15,17.78 ; -24.15,24.4 -24.15,25.4 ; -24.15,26.4 -24.15,25.4 ; -23.15,-25.4 -24.15,-25.4 ; -23.15,-17.78 -24.15,-17.78 ; -23.15,-7.62 -24.15,-7.62 ; -23.15,0 -24.15,0 ; -23.15,7.62 -24.15,7.62 ; -23.15,17.78 -24.15,17.78 ; -23.15,25.4 -24.15,25.4 ; -1,0 0,0 ; 0,-1 0,0 ; 0,1 0,0 ; 1,0 0,0 ; 23.15,-25.4 24.15,-25.4 ; 23.15,-17.78 24.15,-17.78 ; 23.15,-7.62 24.15,-7.62 ; 23.15,7.62 24.15,7.62 ; 23.15,17.78 24.15,17.78 ; 23.15,25.4 24.15,25.4 ; 24.15,-26.4 24.15,-25.4 ; 24.15,-24.4 24.15,-25.4 ; 24.15,-18.78 24.15,-17.78 ; 24.15,-16.78 24.15,-17.78 ; 24.15,-8.62 24.15,-7.62 ; 24.15,-6.62 24.15,-7.62 ; 24.15,6.62 24.15,7.62 ; 24.15,8.62 24.15,7.62 ; 24.15,16.78 24.15,17.78 ; 24.15,18.78 24.15,17.78 ; 24.15,24.4 24.15,25.4 ; 24.15,26.4 24.15,25.4 ; 25.15,-25.4 24.15,-25.4 ; 25.15,-17.78 24.15,-17.78 ; 25.15,-7.62 24.15,-7.62 ; 25.15,7.62 24.15,7.62 ; 25.15,17.78 24.15,17.78 ; 25.15,25.4 24.15,25.4
Mechanical 14:
  lines w0.1: -28.95,-28.5 ccw(c-26.95,-28.5) -26.95,-30.5 26.95,-30.5 ccw(c26.95,-28.5) 28.95,-28.5 28.95,28.5 ccw(c26.95,28.5) 26.95,30.5 -26.95,30.5 ccw(c-26.95,28.5) -28.95,28.5 -28.95,-28.5
  text "TRM" at -22.175,-0.695 h1.27
  text "-VIN" at 18.265,17.125 h1.27
  text "-S" at -22.175,6.925 h1.27
  text "+S" at -22.175,-8.315 h1.27
  text "+V" at -22.175,-18.475 h1.27
  text "-V" at -22.175,17.085 h1.27
  text "CASE" at 18.265,6.965 h1.27
  text "CNT" at 18.265,-8.275 h1.27
  text "+VIN" at 18.265,-18.435 h1.27
3D body "DC-DC_LAMBDA_PAH.stp": height 12.95, standoff -3.8, extent -28.95,-30.5 28.95,30.5

## DCDC_MURATA_HB04UC [mm] "HB04UC Series , Body 50.8x25.4mm, Height 10.4mm"
height 10.41
pads (5):
  round 2 hole 1.3: 1(-22.86,10.16) 2(-22.86,-10.16) 3(22.86,-10.16) 4(22.86,0) 5(22.86,10.16)
Top Overlay:
  lines w0.2: -25.4,-12.7 25.4,-12.7 25.4,12.7 -25.4,12.7 -25.4,-12.7
  text "+VIN" at -21.385,-10.765 h1.2
  text "+VOUT" at 15.725,-10.815 h1.2
  text "-VIN" at -21.385,9.555 h1.2
  text "COM" at 17.825,-0.605 h1.2
  text "-VOUT" at 15.725,9.505 h1.2
Notvisible:
  lines w0.1: -23.36,-10.16 -22.86,-10.16 ; -23.36,10.16 -22.86,10.16 ; -22.86,-10.66 -22.86,-10.16 ; -22.86,-9.66 -22.86,-10.16 ; -22.86,9.66 -22.86,10.16 ; -22.86,10.66 -22.86,10.16 ; -22.36,-10.16 -22.86,-10.16 ; -22.36,10.16 -22.86,10.16 ; -0.5,0 0,0 ; 0,-0.5 0,0 ; 0,0.5 0,0 ; 0.5,0 0,0 ; 22.36,-10.16 22.86,-10.16 ; 22.36,0 22.86,0 ; 22.36,10.16 22.86,10.16 ; 22.86,-10.66 22.86,-10.16 ; 22.86,-9.66 22.86,-10.16 ; 22.86,-0.5 22.86,0 ; 22.86,0.5 22.86,0 ; 22.86,9.66 22.86,10.16 ; 22.86,10.66 22.86,10.16 ; 23.36,-10.16 22.86,-10.16 ; 23.36,0 22.86,0 ; 23.36,10.16 22.86,10.16
Mechanical 14:
  lines w0.1: -25.4,-12.7 25.4,-12.7 25.4,12.7 -25.4,12.7 -25.4,-12.7
  text "+VIN" at -21.385,-10.765 h1.2
  text "+VOUT" at 15.725,-10.815 h1.2
  text "-VIN" at -21.385,9.555 h1.2
  text "COM" at 17.825,-0.605 h1.2
  text "-VOUT" at 15.725,9.505 h1.2
3D body "DCDC_MURATA_HB04UC.stp": height 10.46, standoff -3.8, extent -25.4,-12.7 25.4,12.7